# Altium integrated library MasterRelayModule.IntLib: 29 symbols
Pins are listed as number, name and electrical type; pins without a type are passive.

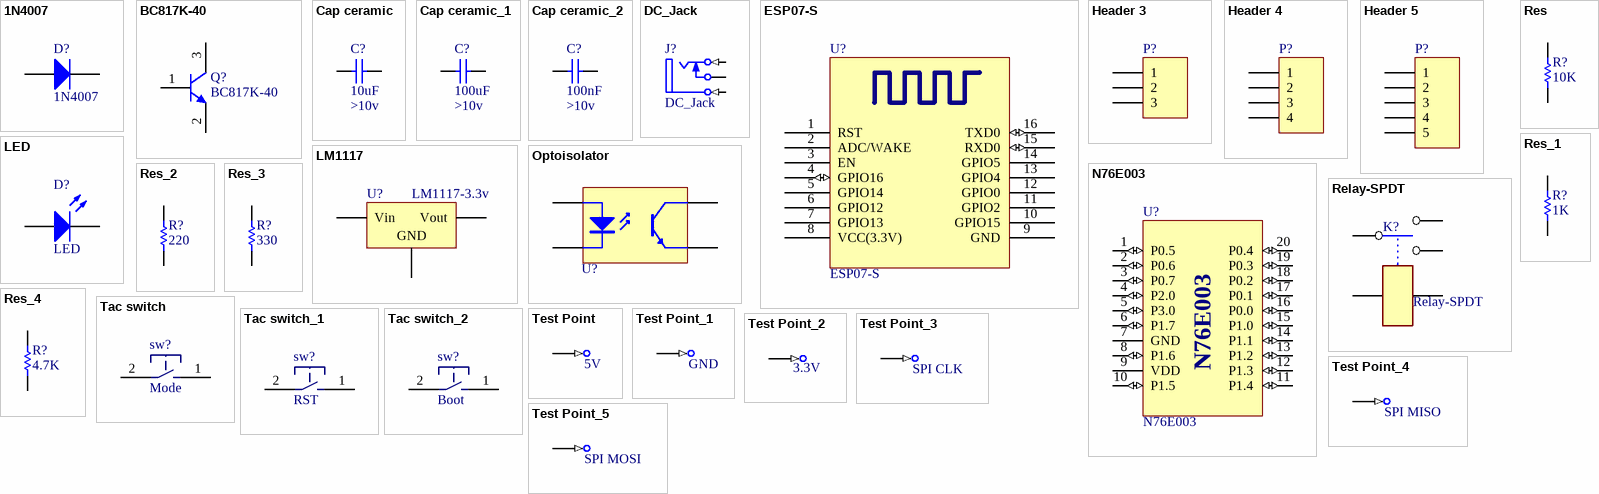
[diagram p0: symbols 1N4007 to Test Point_5]

## 1N4007
designator D?
1 Amp Diode; ASiD Part Number: 1n4007-AS
footprint My_DO41
footprint MY_1206_Diode
footprint MY_0805_Diode
footprint MY_1N4007_SMD
footprint My_DO41_ST
footprint MY_DO214BA
footprint MY_SMA
footprint MY_SMB
footprint MY_SMC
pins: A, K

## BC817K-40
designator Q?
NPN Silicon AF Transistor, 45 V VCEO, 500 mA IC, SOT23, Reel, Green; Manufacturer: Infineon; fT (typ): 170 MHz; Green: TRUE; IBM (max): 200 mA; IC: 100 mA; IC (max): 500 mA; ICBO (max): 100 nA; ICM (max): 1,000 mA; Ptot (max): 500 mW; VCBO (max): 50 V; VCE: 1 V; VCEO (max): 45 V; VEBO (max): 5 V; PackageVersion: Apr-08; PackageReference: SOT23; PackageDescription: 3-Pin Small Outline Transistor Package, 1.3 x 2.9 mm Body, 0.95 mm Pitch; Packing: Reel; Polarity: NPN; Mounting Technology: Surface Mount; PartNumber: BC817K-40; ComponentLink1Description: Manufacturer URL; ComponentLink1URL: http://www.infineon.com/; ComponentLink2Description: Datasheet; ComponentLink2URL: http://www.infineon.com/dgdl/bc817Kseries_bc818Kseries.pdf?folderId=db3a304314dca389011545f4eb561884&fileId=db3a304314dca38901154636aab91919; ComponentLink3Description: Package Specification; ComponentLink3URL: http://www.infineon.com/dgdl/SOT23-Package_Overview.pdf?folderId=db3a30431936bc4b0119532290053c66&fileId=db3a30431936bc4b0119533468123c85
footprint INF-SOT23_N (SOT23, 3-Leads, Body 2.9x1.3 mm, Pitch 0.95 mm, IPC Medium Density)
footprint INF-SOT23_L (SOT23, 3-Leads, Body 2.9x1.3 mm, Pitch 0.95 mm, IPC High Density)
footprint INF-SOT23_M (SOT23, 3-Leads, Body 2.9x1.3 mm, Pitch 0.95 mm, IPC Low Density)
pins: 1 B, 2 E, 3 C

## Cap ceramic
designator C?, comment Volte: >10v  (hidden comment: 10uF)
None polar capacitor; ASiD Part Number: C-AS; Value: 10uF
footprint My_cap100n
footprint MY_1206
footprint MY_0805
footprint MY_1210
footprint MY_1310
footprint MY_1608
footprint MY_1812
footprint MY_1825
footprint MY_2012
footprint MY_2220
footprint MY_2225
footprint MY_3216
footprint MY_3225
footprint MY_4532
footprint MY_4564
footprint MY_0201
footprint MY_0402
footprint MY_0603
footprint MY_E5-7.5mm
footprint MY_E6-10mm
footprint MY_E8.4-15mm
footprint MY_2010
footprint MY_1218
footprint MY_E5-7.5mmB
footprint MY_E8.7-26.8mm
footprint MY_E9.3-31.6mm
footprint MY_E3.2-10.3mm
footprint MY_2512 (R2512)
pins: 1, 2

## Cap ceramic_1
designator C?, comment Volte: >10v  (hidden comment: 100uF)
None polar capacitor; ASiD Part Number: C-AS; Value: 100uF
footprint My_cap100n
footprint MY_1206
footprint MY_0805
footprint MY_1210
footprint MY_1310
footprint MY_1608
footprint MY_1812
footprint MY_1825
footprint MY_2012
footprint MY_2220
footprint MY_2225
footprint MY_3216
footprint MY_3225
footprint MY_4532
footprint MY_4564
footprint MY_0201
footprint MY_0402
footprint MY_0603
footprint MY_E5-7.5mm
footprint MY_E6-10mm
footprint MY_E8.4-15mm
footprint MY_2010
footprint MY_1218
footprint MY_E5-7.5mmB
footprint MY_E8.7-26.8mm
footprint MY_E9.3-31.6mm
footprint MY_E3.2-10.3mm
footprint MY_2512 (R2512)
pins: 1, 2

## Cap ceramic_2
designator C?, comment Volte: >10v  (hidden comment: 100nF)
None polar capacitor; ASiD Part Number: C-AS; Value: 100nF
footprint My_cap100n
footprint MY_1206
footprint MY_0805
footprint MY_1210
footprint MY_1310
footprint MY_1608
footprint MY_1812
footprint MY_1825
footprint MY_2012
footprint MY_2220
footprint MY_2225
footprint MY_3216
footprint MY_3225
footprint MY_4532
footprint MY_4564
footprint MY_0201
footprint MY_0402
footprint MY_0603
footprint MY_E5-7.5mm
footprint MY_E6-10mm
footprint MY_E8.4-15mm
footprint MY_2010
footprint MY_1218
footprint MY_E5-7.5mmB
footprint MY_E8.7-26.8mm
footprint MY_E9.3-31.6mm
footprint MY_E3.2-10.3mm
footprint MY_2512 (R2512)
pins: 1, 2

## DC_Jack
designator J?
ASiD Part Number: DC_Jack-AS
footprint My_DC_Jack
signal-integrity model JACK Socket
pins: 1 T (in) "Tip", 2 TN "Tip Normal (Break Contact)", 3 S (in) "Sleeve (Ground)"

## ESP07-S
designator U?
footprint ESP07-S
pins: 1 RST "Reset", 2 ADC/WAKE "ADC Input Or TOUT Output", 3 EN, 4 GPIO16 (io) "Chip enable", 5 GPIO14 "GPIO16 or Deep-Sleep Wakeup", 6 GPIO12 "GPIO14 or SPI CLK", 7 GPIO13 "GPIO12 or SPIQ", 8 VCC(3.3V) "Power supply", 9 GND "Power supply", 10 GPIO15 "GPIO13 or SPID", 11 GPIO2 "GPIO15 or SPICS", 12 GPIO0 "GPIO2 or TX", 13 GPIO4 "GPIO0 or SPICS2", 14 GPIO5 "GPIO15 or SPICS", 15 RXD0 (io), 16 TXD0 (io)

## Header 3
designator P?  (value not drawn)
Header, 3-Pin; ASiD Part Number: Header 3-AS
footprint My_1X03
signal-integrity model Connector
footprint My_CN3
footprint MY_MSTBA3
footprint MY_6410-03
footprint MY_7395-03
footprint MY_FE03
footprint MY_FE03W
footprint MY_MA03-1W
pins: 1, 2, 3

## Header 4
designator P?  (value not drawn)
Header, 4-Pin; ASiD Part Number: Header 4-AS
footprint My_1X04
signal-integrity model Connector
footprint MY_MSTBA4
footprint MY_FPC4_1mm
footprint MY_6410-04
footprint MY_7395-04
footprint MY_FE04
footprint MY_FE04W
footprint MY_MA04-1W
pins: 1, 2, 3, 4

## Header 5
designator P?  (value not drawn)
Header, 5-Pin; ASiD Part Number: Header 5-AS
footprint My_1X05
signal-integrity model Connector
footprint MY_MSTBA5
footprint MY_1x05_SMD
footprint MY_6410-05
footprint MY_7395-05
footprint MY_FE05
footprint MY_FE05W
footprint MY_MA05-1W
pins: 1, 2, 3, 4, 5

## LED
designator D?
Typical INFRARED GaAs LED; ASiD Part Number: LED-AS
footprint My_LED3MM
footprint MY_LED5MM
footprint MY_SQ_LED
footprint MY_LED_0805
footprint MY_LED_1206
pins: A, K

## LM1117
designator U?, comment LM1117-3.3v
Low Drop Voltage Reg; ASiD Part Number: LM1117-AS
footprint MY_SOT223
pins: 1 GND, 2 Vout, 3 Vin

## N76E003
designator U?
footprint SOP_20
pins: 1 P0.5 (io), 2 P0.6 (io), 3 P0.7 (io), 4 P2.0 (io), 5 P3.0 (io), 6 P1.7 (io), 7 GND (power), 8 P1.6 (io), 9 VDD (power), 10 P1.5 (io), 11 P1.4 (io), 12 P1.3 (io), 13 P1.2 (io), 14 P1.1 (io), 15 P1.0 (io), 16 P0.0 (io), 17 P0.1 (io), 18 P0.2 (io), 19 P0.3 (io), 20 P0.4 (io)

## Optoisolator
designator U?  (value not drawn)
ASiD Part Number: Optoisolator-AS
footprint My_opto
footprint MY_Photo_Reflector
footprint MY_OPTO_SMD4
footprint MY_OPTO_SMD4-7
footprint MY_LTH301-05
pins: 1 A, 2 K, 3 E, 4 C

## Relay-SPDT
designator K?
Standard single contact relay; ASiD Part Number: Relay-SPDT-AS
footprint My_rel
pins: 1, 2, 3, 4, 5

## Res
designator R?, comment 10K
Standard resistor; ASiD Part Number: Res-AS; Value: 10K
footprint MY_1206
footprint MY_0805
footprint MY_1210
footprint MY_1310
footprint MY_1608
footprint MY_1812
footprint MY_1825
footprint MY_2012
footprint MY_2220
footprint MY_2225
footprint MY_3216
footprint MY_3225
footprint MY_4532
footprint MY_4564
footprint MY_0201
footprint MY_0402
footprint MY_0603
footprint MY_(0.25w)_0207V
footprint MY_(0.25w)_0207_10
footprint MY_0309V
footprint MY_0309_12
footprint MY_0414V
footprint MY_0414_15
footprint MY_(0.5w)_0411V
footprint MY_(0.5w)_0411_15
footprint MY_(1w)_0613V
footprint MY_(1w)_0613_15
footprint MY_(2w)_0617V
footprint MY_(2w)_0617_22
footprint MY_(3w)_0817V
footprint MY_(3w)_0817_22
footprint MY_(5w)_0922V
footprint MY_(5w)_0922_22
footprint MY_2010
footprint MY_1218
footprint MY_2512 (R2512)
pins: 1, 2

## Res_1
designator R?, comment 1K
Standard resistor; ASiD Part Number: Res-AS; Value: 1K
footprint MY_1206
footprint MY_0805
footprint MY_1210
footprint MY_1310
footprint MY_1608
footprint MY_1812
footprint MY_1825
footprint MY_2012
footprint MY_2220
footprint MY_2225
footprint MY_3216
footprint MY_3225
footprint MY_4532
footprint MY_4564
footprint MY_0201
footprint MY_0402
footprint MY_0603
footprint MY_(0.25w)_0207V
footprint MY_(0.25w)_0207_10
footprint MY_0309V
footprint MY_0309_12
footprint MY_0414V
footprint MY_0414_15
footprint MY_(0.5w)_0411V
footprint MY_(0.5w)_0411_15
footprint MY_(1w)_0613V
footprint MY_(1w)_0613_15
footprint MY_(2w)_0617V
footprint MY_(2w)_0617_22
footprint MY_(3w)_0817V
footprint MY_(3w)_0817_22
footprint MY_(5w)_0922V
footprint MY_(5w)_0922_22
footprint MY_2010
footprint MY_1218
footprint MY_2512 (R2512)
pins: 1, 2

## Res_2
designator R?, comment 220
Standard resistor; ASiD Part Number: Res-AS; Value: 220
footprint MY_1206
footprint MY_0805
footprint MY_1210
footprint MY_1310
footprint MY_1608
footprint MY_1812
footprint MY_1825
footprint MY_2012
footprint MY_2220
footprint MY_2225
footprint MY_3216
footprint MY_3225
footprint MY_4532
footprint MY_4564
footprint MY_0201
footprint MY_0402
footprint MY_0603
footprint MY_(0.25w)_0207V
footprint MY_(0.25w)_0207_10
footprint MY_0309V
footprint MY_0309_12
footprint MY_0414V
footprint MY_0414_15
footprint MY_(0.5w)_0411V
footprint MY_(0.5w)_0411_15
footprint MY_(1w)_0613V
footprint MY_(1w)_0613_15
footprint MY_(2w)_0617V
footprint MY_(2w)_0617_22
footprint MY_(3w)_0817V
footprint MY_(3w)_0817_22
footprint MY_(5w)_0922V
footprint MY_(5w)_0922_22
footprint MY_2010
footprint MY_1218
footprint MY_2512 (R2512)
pins: 1, 2

## Res_3
designator R?, comment 330
Standard resistor; ASiD Part Number: Res-AS; Value: 330
footprint MY_1206
footprint MY_0805
footprint MY_1210
footprint MY_1310
footprint MY_1608
footprint MY_1812
footprint MY_1825
footprint MY_2012
footprint MY_2220
footprint MY_2225
footprint MY_3216
footprint MY_3225
footprint MY_4532
footprint MY_4564
footprint MY_0201
footprint MY_0402
footprint MY_0603
footprint MY_(0.25w)_0207V
footprint MY_(0.25w)_0207_10
footprint MY_0309V
footprint MY_0309_12
footprint MY_0414V
footprint MY_0414_15
footprint MY_(0.5w)_0411V
footprint MY_(0.5w)_0411_15
footprint MY_(1w)_0613V
footprint MY_(1w)_0613_15
footprint MY_(2w)_0617V
footprint MY_(2w)_0617_22
footprint MY_(3w)_0817V
footprint MY_(3w)_0817_22
footprint MY_(5w)_0922V
footprint MY_(5w)_0922_22
footprint MY_2010
footprint MY_1218
footprint MY_2512 (R2512)
pins: 1, 2

## Res_4
designator R?, comment 4.7K
Standard resistor; ASiD Part Number: Res-AS; Value: 4.7K
footprint MY_1206
footprint MY_0805
footprint MY_1210
footprint MY_1310
footprint MY_1608
footprint MY_1812
footprint MY_1825
footprint MY_2012
footprint MY_2220
footprint MY_2225
footprint MY_3216
footprint MY_3225
footprint MY_4532
footprint MY_4564
footprint MY_0201
footprint MY_0402
footprint MY_0603
footprint MY_(0.25w)_0207V
footprint MY_(0.25w)_0207_10
footprint MY_0309V
footprint MY_0309_12
footprint MY_0414V
footprint MY_0414_15
footprint MY_(0.5w)_0411V
footprint MY_(0.5w)_0411_15
footprint MY_(1w)_0613V
footprint MY_(1w)_0613_15
footprint MY_(2w)_0617V
footprint MY_(2w)_0617_22
footprint MY_(3w)_0817V
footprint MY_(3w)_0817_22
footprint MY_(5w)_0922V
footprint MY_(5w)_0922_22
footprint MY_2010
footprint MY_1218
footprint MY_2512 (R2512)
pins: 1, 2

## Tac switch
designator sw?, comment Mode
small tac switch; ASiD Part Number: Tac switch-AS
footprint MY_TACTILE-PTH
footprint MY_TACTILE-PTH_4X
footprint MY_TACTILE-SMD
footprint MY_PB-SMD (Switch; 2 Leads)
pins: 1, 2

## Tac switch_1
designator sw?, comment RST
small tac switch; ASiD Part Number: Tac switch-AS
footprint MY_TACTILE-PTH
footprint MY_TACTILE-PTH_4X
footprint MY_TACTILE-SMD
footprint MY_PB-SMD (Switch; 2 Leads)
pins: 1, 2

## Tac switch_2
designator sw?, comment Boot
small tac switch; ASiD Part Number: Tac switch-AS
footprint MY_TACTILE-PTH
footprint MY_TACTILE-PTH_4X
footprint MY_TACTILE-SMD
footprint MY_PB-SMD (Switch; 2 Leads)
pins: 1, 2

## Test Point
designator TP?, comment 5V  (no BOM)
Test point; ASiD Part Number: Test Point-AS
footprint MY_TestPin
footprint MY_Testpad1
footprint MY_Testpad2
pins: 1 (in)

## Test Point_1
designator TP?, comment GND  (no BOM)
Test point; ASiD Part Number: Test Point-AS
footprint MY_TestPin
footprint MY_Testpad1
footprint MY_Testpad2
pins: 1 (in)

## Test Point_2
designator TP?, comment 3.3V  (no BOM)
Test point; ASiD Part Number: Test Point-AS
footprint MY_TestPin
footprint MY_Testpad1
footprint MY_Testpad2
pins: 1 (in)

## Test Point_3
designator TP?, comment SPI CLK  (no BOM)
Test point; ASiD Part Number: Test Point-AS
footprint MY_TestPin
footprint MY_Testpad1
footprint MY_Testpad2
pins: 1 (in)

## Test Point_4
designator TP?, comment SPI MISO  (no BOM)
Test point; ASiD Part Number: Test Point-AS
footprint MY_TestPin
footprint MY_Testpad1
footprint MY_Testpad2
pins: 1 (in)

## Test Point_5
designator TP?, comment SPI MOSI  (no BOM)
Test point; ASiD Part Number: Test Point-AS
footprint MY_TestPin
footprint MY_Testpad1
footprint MY_Testpad2
pins: 1 (in)